# Altium footprint library Connectors_rus.PcbLib: 53 footprints (part 1 of 4)
Each footprint in its own frame and in the unit in brackets; x right, y up, seen from the top. Pads: shape width x height; smd on the part's side, far side on the other; paste and mask are expansions set on the pad; w line width, h text height; cw(c..) or ccw(c..) is an arc to the next point about the centre after c.
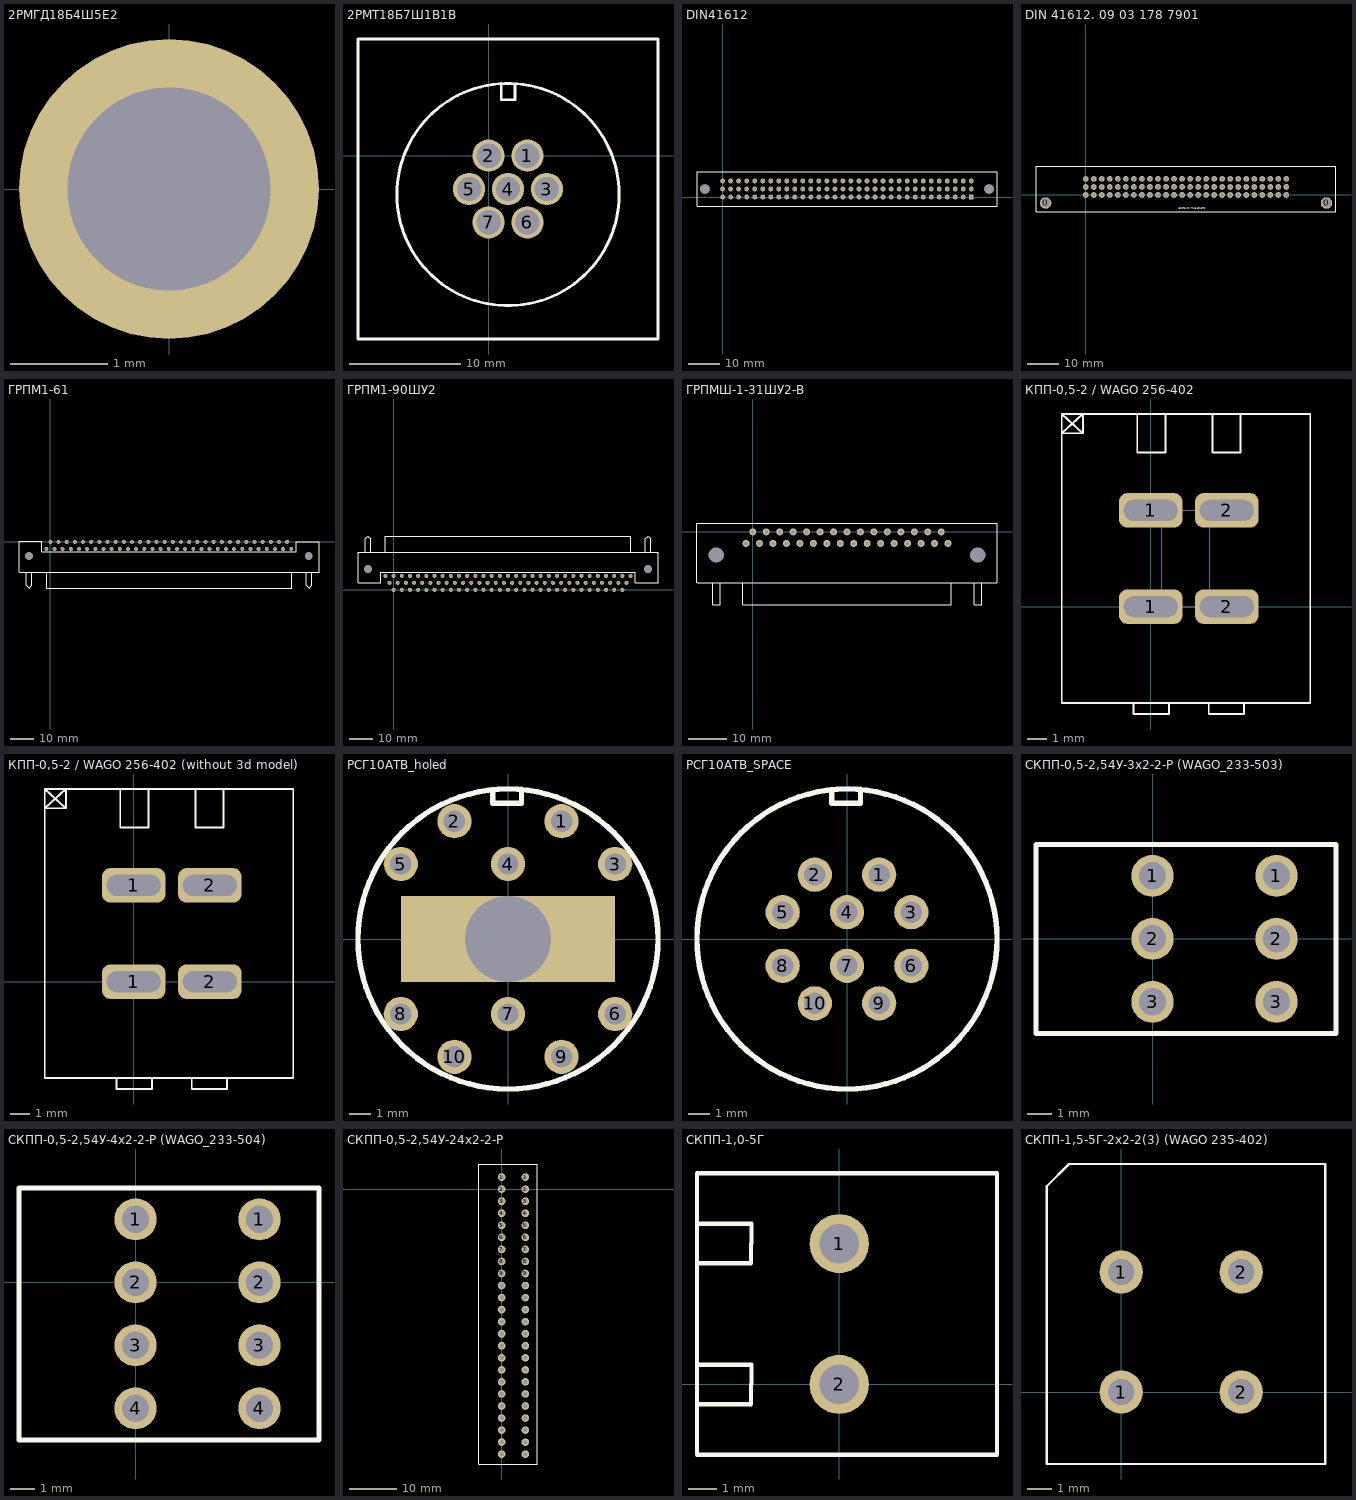
[diagram p0: the footprints below, top view; thin cyan lines are the x and y axes]

## 2РМГД18Б4Ш5Е2 [mm]
pads (1):
  round 3.1 hole 2.1 unplated: ""(0,0)

## 2РМТ18Б7Ш1В1В [mm]
pads (7):
  round 2.9 hole 2.2: 1(3.5,0) 2(0,0) 3(5.25,-3) 4(1.75,-3) 5(-1.75,-3) 6(3.5,-6) 7(0,-6)
Top Overlay:
  circle w0.254: c1.75,-3.5 r10
  lines w0.254: 1.15,6.49 1.15,5.03 2.37,5.03 2.37,6.48 ; -11.75,-16.5 -11.75,-3 -11.75,10.5 1.75,10.5 15.25,10.5 15.25,-3 15.25,-16.5 1.75,-16.5 -11.75,-16.5

## DIN41612 [mm]
height 12
pads (98):
  rect 1.5x1.5 hole 1: 1A(78.75,0)
  round 1.5 hole 1: 1B(78.74,2.54) 1C(78.74,5.08) 2A(76.2,0) 2B(76.19,2.54) 2C(76.19,5.08) 3A(73.65,0) 3B(73.64,2.54) 3C(73.64,5.08) 4A(71.12,0) 4B(71.11,2.54) 4C(71.11,5.08) 5A(68.58,0) 5B(68.57,2.54) 5C(68.57,5.08) 6A(66.04,0) 6B(66.03,2.54) 6C(66.03,5.08) 7A(63.5,0) 7B(63.49,2.54) 7C(63.49,5.08) 8A(60.96,0) 8B(60.95,2.54) 8C(60.95,5.08) 9A(58.42,0) 9B(58.41,2.54) 9C(58.41,5.08) 10A(55.88,0) 10B(55.87,2.54) 10C(55.87,5.08) 11A(53.33,0) 11B(53.32,2.54) 11C(53.32,5.08) 12A(50.78,0) 12B(50.77,2.54) 12C(50.77,5.08) 13A(48.25,0) 13B(48.24,2.54) 13C(48.24,5.08) 14A(45.71,0) 14B(45.7,2.54) 14C(45.7,5.08) 15A(43.17,0) 15B(43.16,2.54) 15C(43.16,5.08) 16A(40.63,0) 16B(40.62,2.54) 16C(40.62,5.08) 17A(38.09,0) 17B(38.08,2.54) 17C(38.08,5.08) 18A(35.55,0) 18B(35.54,2.54) 18C(35.54,5.08) 19A(33.02,0) 19B(33.01,2.54) 19C(33.01,5.08) 20A(30.47,0) 20B(30.46,2.54) 20C(30.46,5.08) 21A(27.92,0) 21B(27.91,2.54) 21C(27.91,5.08) 22A(25.39,0) 22B(25.38,2.54) 22C(25.38,5.08) 23A(22.85,0) 23B(22.84,2.54) 23C(22.84,5.08) 24A(20.31,0) 24B(20.3,2.54) 24C(20.3,5.08) 25A(17.77,0) 25B(17.76,2.54) 25C(17.76,5.08) 26A(15.23,0) 26B(15.22,2.54) 26C(15.22,5.08) 27A(12.69,0) 27B(12.68,2.54) 27C(12.68,5.08) 28A(10.15,0) 28B(10.14,2.54) 28C(10.14,5.08) 29A(7.6,0) 29B(7.59,2.54) 29C(7.59,5.08) 30A(5.05,0) 30B(5.04,2.54) 30C(5.04,5.08) 31A(2.52,0) 31B(2.51,2.54) 31C(2.51,5.08) 32A(-0.02,0) 32B(-0.03,2.54) 32C(-0.03,5.08)
  round 3 hole 3: MH1(-5.63,2.54) MH2(84.37,2.54)
Top Overlay:
  lines w0.254: -8.13,-2.86 86.87,-2.86 86.87,7.94 -8.13,7.94 -8.13,-2.86

## DIN 41612. 09 03 178 7901 [mm]
pads (80):
  round 3.6 hole 3: 0(-12.7,-2.54) 0(76.2,-2.54)
  round 1.8 hole 1.2: A1(63.5,0) A2(60.96,0) A3(58.42,0) A4(55.88,0) A5(53.34,0) A6(50.8,0) A7(48.26,0) A8(45.72,0) A9(43.18,0) A10(40.64,0) A11(38.1,0) A12(35.56,0) A13(33.02,0) A14(30.48,0) A15(27.94,0) A16(25.4,0) A17(22.86,0) A18(20.32,0) A19(17.78,0) A20(15.24,0) A21(12.7,0) A22(10.16,0) A23(7.62,0) A24(5.08,0) A25(2.54,0) A26(0,0) B1(63.5,2.54) B2(60.96,2.54) B3(58.42,2.54) B4(55.88,2.54) B5(53.34,2.54) B6(50.8,2.54) B7(48.26,2.54) B8(45.72,2.54) B9(43.18,2.54) B10(40.64,2.54) B11(38.1,2.54) B12(35.56,2.54) B13(33.02,2.54) B14(30.48,2.54) B15(27.94,2.54) B16(25.4,2.54) B17(22.86,2.54) B18(20.32,2.54) B19(17.78,2.54) B20(15.24,2.54) B21(12.7,2.54) B22(10.16,2.54) B23(7.62,2.54) B24(5.08,2.54) B25(2.54,2.54) B26(0,2.54) C1(63.5,5.08) C2(60.96,5.08) C3(58.42,5.08) C4(55.88,5.08) C5(53.34,5.08) C6(50.8,5.08) C7(48.26,5.08) C8(45.72,5.08) C9(43.18,5.08) C10(40.64,5.08) C11(38.1,5.08) C12(35.56,5.08) C13(33.02,5.08) C14(30.48,5.08) C15(27.94,5.08) C16(25.4,5.08) C17(22.86,5.08) C18(20.32,5.08) C19(17.78,5.08) C20(15.24,5.08) C21(12.7,5.08) C22(10.16,5.08) C23(7.62,5.08) C24(5.08,5.08) C25(2.54,5.08) C26(0,5.08)
Top Overlay:
  lines w0.3: -15.75,-5.25 79.15,-5.25 79.2,-5.2 79.2,-2.54 79.2,9.02 -15.7,9.02 -15.75,8.97 -15.75,-2.59 -15.75,-5.25
  text "EDGE OF THE BOARD" at 29.45,-4.82 h1

## ГРПМ1-61 [mm]
pads (63):
  round 1.6 hole 3.4: 0(-9.25,-6) 0(110.75,-6)
  round 1.7 hole 1.1: A1(0,0) A2(3.5,0) A3(7,0) A4(10.5,0) A5(14,0) A6(17.5,0) A7(21,0) A8(24.5,0) A9(28,0) A10(31.5,0) A11(35,0) A12(38.5,0) A13(42,0) A14(45.5,0) A15(49,0) A16(52.5,0) A17(56,0) A18(59.5,0) A19(63,0) A20(66.5,0) A21(70,0) A22(73.5,0) A23(77,0) A24(80.5,0) A25(84,0) A26(87.5,0) A27(91,0) A28(94.5,0) A29(98,0) A30(101.5,0) B1(-1.75,-3) B2(1.75,-3) B3(5.25,-3) B4(8.75,-3) B5(12.25,-3) B6(15.75,-3) B7(19.25,-3) B8(22.75,-3) B9(26.25,-3) B10(29.75,-3) B11(33.25,-3) B12(36.75,-3) B13(40.25,-3) B14(43.75,-3) B15(47.25,-3) B16(50.75,-3) B17(54.25,-3) B18(57.75,-3) B19(61.25,-3) B20(64.75,-3) B21(68.25,-3) B22(71.75,-3) B23(75.25,-3) B24(78.75,-3) B25(82.25,-3) B26(85.75,-3) B27(89.25,-3) B28(92.75,-3) B29(96.25,-3) B30(99.75,-3) B31(103.25,-3)
Top Overlay:
  lines w0.2: -13.45,-13 110.8,-13 ; -13.45,-12.9 -13.45,0.3 -3.7,0.3 -3.7,-4.2 105.3,-4.2 ; -10.3,-13 -10.3,-18.6 -9.1,-19.8 -7.9,-18.6 -7.9,-13 ; -1.6,-13 -1.6,-19.8 103.4,-19.8 103.4,-13 ; 105.4,-4.4 105.4,0.1 110.9,0.1 115.15,0.1 115.15,-13.1 ; 109.7,-13 109.7,-18.6 110.9,-19.8 112.1,-18.6 112.1,-13 ; 110.9,-13 115.15,-13
3D body "ГРПМШ-61.stp": height 8, standoff -4.2, extent -14.069,-20.015 115.931,0.41

## ГРПМ1-90ШУ2 [mm]
pads (92):
  round 1.6 hole 3.4: 0(-11,9) 0(109,9)
  round 1.7 hole 1.1: A1(0,0) A2(3.5,0) A3(7,0) A4(10.5,0) A5(14,0) A6(17.5,0) A7(21,0) A8(24.5,0) A9(28,0) A10(31.5,0) A11(35,0) A12(38.5,0) A13(42,0) A14(45.5,0) A15(49,0) A16(52.5,0) A17(56,0) A18(59.5,0) A19(63,0) A20(66.5,0) A21(70,0) A22(73.5,0) A23(77,0) A24(80.5,0) A25(84,0) A26(87.5,0) A27(91,0) A28(94.5,0) A29(98,0) Б1(-1.75,3) Б2(1.75,3) Б3(5.25,3) Б4(8.75,3) Б5(12.25,3) Б6(15.75,3) Б7(19.25,3) Б8(22.75,3) Б9(26.25,3) Б10(29.75,3) Б11(33.25,3) Б12(36.75,3) Б13(40.25,3) Б14(43.75,3) Б15(47.25,3) Б16(50.75,3) Б17(54.25,3) Б18(57.75,3) Б19(61.25,3) Б20(64.75,3) Б21(68.25,3) Б22(71.75,3) Б23(75.25,3) Б24(78.75,3) Б25(82.25,3) Б26(85.75,3) Б27(89.25,3) Б28(92.75,3) Б29(96.25,3) Б30(99.75,3) В1(-3.5,6) В2(0,6) В3(3.5,6) В4(7,6) В5(10.5,6) В6(14,6) В7(17.5,6) В8(21,6) В9(24.5,6) В10(28,6) В11(31.5,6) В12(35,6) В13(38.5,6) В14(42,6) В15(45.5,6) В16(49,6) В17(52.5,6) В18(56,6) В19(59.5,6) В20(63,6) В21(66.5,6) В22(70,6) В23(73.5,6) В24(77,6) В25(80.5,6) В26(84,6) В27(87.5,6) В28(91,6) В29(94.5,6) В30(98,6) В31(101.5,6)
Top Overlay:
  lines w0.2: -12.2,16.2 -12.2,21.8 -11,23 -9.8,21.8 -9.8,16.2 ; -3.5,16.2 -3.5,23 101.5,23 101.5,16.2 ; 107.8,16.2 107.8,21.8 109,23 110.2,21.8 110.2,16.2 ; -15.25,3 -15.25,16.2 -11,16.2 113.25,16.2 113.25,3 103.5,3 103.5,7.5 -5.5,7.5 -5.5,3 -11,3 -15.25,3
3D body: height 10.5, standoff 0, extent -15.25,3 113.25,16.2
3D body: height 9.4, standoff 8.6, extent -3.897,14.3 -3.1,22.3
3D body: height 9.4, standoff 8.6, extent -0.397,14.3 0.4,22.3
3D body: height 9.4, standoff 8.6, extent 3.103,14.3 3.9,22.3
3D body: height 9.4, standoff 8.6, extent 6.603,14.3 7.4,22.3
3D body: height 9.4, standoff 8.6, extent 10.103,14.3 10.9,22.3
3D body: height 9.4, standoff 8.6, extent 13.603,14.3 14.4,22.3
3D body: height 9.4, standoff 8.6, extent 17.103,14.3 17.9,22.3
3D body: height 9.4, standoff 8.6, extent 20.603,14.3 21.4,22.3
3D body: height 9.4, standoff 8.6, extent 24.103,14.3 24.9,22.3
3D body: height 9.4, standoff 8.6, extent 27.603,14.3 28.4,22.3
3D body: height 9.4, standoff 8.6, extent 31.103,14.3 31.9,22.3
3D body: height 9.4, standoff 8.6, extent 34.603,14.3 35.4,22.3
3D body: height 9.4, standoff 8.6, extent 38.103,14.3 38.9,22.3
3D body: height 9.4, standoff 8.6, extent 41.603,14.3 42.4,22.3
3D body: height 9.4, standoff 8.6, extent 45.103,14.3 45.9,22.3
3D body: height 9.4, standoff 8.6, extent 48.603,14.3 49.4,22.3
3D body: height 9.4, standoff 8.6, extent 52.103,14.3 52.9,22.3
3D body: height 9.4, standoff 8.6, extent 55.603,14.3 56.4,22.3
3D body: height 9.4, standoff 8.6, extent 59.103,14.3 59.9,22.3
3D body: height 9.4, standoff 8.6, extent 62.603,14.3 63.4,22.3
3D body: height 9.4, standoff 8.6, extent 66.103,14.3 66.9,22.3
3D body: height 9.4, standoff 8.6, extent 69.603,14.3 70.4,22.3
3D body: height 9.4, standoff 8.6, extent 73.103,14.3 73.9,22.3
3D body: height 9.4, standoff 8.6, extent 76.603,14.3 77.4,22.3
3D body: height 9.4, standoff 8.6, extent 80.103,14.3 80.9,22.3
3D body: height 9.4, standoff 8.6, extent 83.603,14.3 84.4,22.3
3D body: height 9.4, standoff 8.6, extent 87.103,14.3 87.9,22.3
3D body: height 9.4, standoff 8.6, extent 90.603,14.3 91.4,22.3
3D body: height 9.4, standoff 8.6, extent 94.103,14.3 94.9,22.3
3D body: height 9.4, standoff 8.6, extent 97.603,14.3 98.4,22.3
3D body: height 9.4, standoff 8.6, extent 101.103,14.3 101.9,22.3
3D body: height 6.4, standoff 5.6, extent -2.147,15.8 -1.35,22.3
3D body: height 6.4, standoff 5.6, extent 1.353,15.8 2.15,22.3
3D body: height 6.4, standoff 5.6, extent 4.853,15.8 5.65,22.3
3D body: height 6.4, standoff 5.6, extent 8.353,15.8 9.15,22.3
3D body: height 6.4, standoff 5.6, extent 11.853,15.8 12.65,22.3
3D body: height 6.4, standoff 5.6, extent 15.353,15.8 16.15,22.3
3D body: height 6.4, standoff 5.6, extent 18.853,15.8 19.65,22.3
3D body: height 6.4, standoff 5.6, extent 22.353,15.8 23.15,22.3
3D body: height 6.4, standoff 5.6, extent 25.853,15.8 26.65,22.3
3D body: height 6.4, standoff 5.6, extent 29.303,15.8 30.1,22.3
3D body: height 6.4, standoff 5.6, extent 32.853,15.8 33.65,22.3
3D body: height 6.4, standoff 5.6, extent 36.353,15.8 37.15,22.3
3D body: height 6.4, standoff 5.6, extent 39.853,15.8 40.65,22.3
3D body: height 6.4, standoff 5.6, extent 43.353,15.8 44.15,22.3
3D body: height 6.4, standoff 5.6, extent 47.003,15.8 47.8,22.3
3D body: height 6.4, standoff 5.6, extent 50.353,15.8 51.15,22.3
3D body: height 6.4, standoff 5.6, extent 53.853,15.8 54.65,22.3
3D body: height 6.4, standoff 5.6, extent 57.353,15.8 58.15,22.3
3D body: height 6.4, standoff 5.6, extent 60.853,15.8 61.65,22.3
3D body: height 6.4, standoff 5.6, extent 64.353,15.8 65.15,22.3
3D body: height 6.4, standoff 5.6, extent 67.853,15.8 68.65,22.3
3D body: height 6.4, standoff 5.6, extent 71.353,15.8 72.15,22.3
3D body: height 6.4, standoff 5.6, extent 74.853,15.8 75.65,22.3
3D body: height 6.4, standoff 5.6, extent 78.353,15.8 79.15,22.3
3D body: height 6.4, standoff 5.6, extent 81.853,15.8 82.65,22.3
3D body: height 6.4, standoff 5.6, extent 85.353,15.8 86.15,22.3
3D body: height 6.4, standoff 5.6, extent 88.853,15.8 89.65,22.3
3D body: height 6.4, standoff 5.6, extent 92.353,15.8 93.15,22.3
3D body: height 6.4, standoff 5.6, extent 95.853,15.8 96.65,22.3
3D body: height 6.4, standoff 5.6, extent 99.353,15.8 100.15,22.3
3D body: height 3.4, standoff 2.6, extent -0.397,15.8 0.4,22.3
3D body: height 3.4, standoff 2.6, extent 3.103,15.8 3.9,22.3
3D body: height 3.4, standoff 2.6, extent 6.603,15.8 7.4,22.3
3D body: height 3.4, standoff 2.6, extent 10.103,15.8 10.9,22.3
3D body: height 3.4, standoff 2.6, extent 24.103,15.8 24.9,22.3
3D body: height 3.4, standoff 2.6, extent 20.603,15.8 21.4,22.3
3D body: height 3.4, standoff 2.6, extent 17.103,15.8 17.9,22.3
3D body: height 3.4, standoff 2.6, extent 13.603,15.8 14.4,22.3
3D body: height 3.4, standoff 2.6, extent 38.103,15.8 38.9,22.3
3D body: height 3.4, standoff 2.6, extent 34.603,15.8 35.4,22.3
3D body: height 3.4, standoff 2.6, extent 31.103,15.8 31.9,22.3
3D body: height 3.4, standoff 2.6, extent 27.603,15.8 28.4,22.3
3D body: height 3.4, standoff 2.6, extent 52.103,15.8 52.9,22.3
3D body: height 3.4, standoff 2.6, extent 48.603,15.8 49.4,22.3
3D body: height 3.4, standoff 2.6, extent 45.103,15.8 45.9,22.3
3D body: height 3.4, standoff 2.6, extent 41.603,15.8 42.4,22.3
3D body: height 3.4, standoff 2.6, extent 66.103,15.8 66.9,22.3
3D body: height 3.4, standoff 2.6, extent 62.603,15.8 63.4,22.3
3D body: height 3.4, standoff 2.6, extent 59.103,15.8 59.9,22.3
3D body: height 3.4, standoff 2.6, extent 55.603,15.8 56.4,22.3
3D body: height 3.4, standoff 2.6, extent 80.103,15.8 80.9,22.3
3D body: height 3.4, standoff 2.6, extent 76.603,15.8 77.4,22.3
3D body: height 3.4, standoff 2.6, extent 73.103,15.8 73.9,22.3
3D body: height 3.4, standoff 2.6, extent 69.603,15.8 70.4,22.3
3D body: height 3.4, standoff 2.6, extent 94.103,15.8 94.9,22.3
3D body: height 3.4, standoff 2.6, extent 90.603,15.8 91.4,22.3
3D body: height 3.4, standoff 2.6, extent 87.103,15.8 87.9,22.3
3D body: height 3.4, standoff 2.6, extent 83.603,15.8 84.4,22.3
3D body: height 3.4, standoff 2.6, extent 97.603,15.8 98.4,22.3
3D body: height 6.5, standoff 3.5, extent -12.488,14.3 -9.5,22.3
3D body: height 6.5, standoff 3.5, extent 107.512,14.3 110.5,22.3

## ГРПМШ-1-31ШУ2-В [mm]
pads (33):
  round 1.8 hole 4: 0(-9.5,-6) 0(58.5,-6)
  round 1.8 hole 1: A1(49,0) A2(45.5,0) A3(42,0) A4(38.5,0) A5(35,0) A6(31.5,0) A7(28,0) A8(24.5,0) A9(21,0) A10(17.5,0) A11(14,0) A12(10.5,0) A13(7,0) A14(3.5,0) A15(0,0) B1(50.75,-3) B2(47.25,-3) B3(43.75,-3) B4(40.25,-3) B5(36.75,-3) B6(33.25,-3) B7(29.75,-3) B8(26.25,-3) B9(22.75,-3) B10(19.25,-3) B11(15.75,-3) B12(12.25,-3) B13(8.75,-3) B14(5.25,-3) B15(1.75,-3) B16(-1.75,-3)
Top Overlay:
  lines w0.1: -14.5,2.23 -9.5,2.23
  lines w0.15: -14.5,-13.2 -14.5,-6 -14.5,2.23 ; -14.47,-13.2 -9.5,-13.2 63.47,-13.2 ; -10.42,-13.21 -10.42,-18.94 -9.44,-18.94 -8.46,-18.94 -8.46,-13.21 ; -9.5,2.23 19.89,2.23 58.5,2.23 63.5,2.23 63.5,-6 63.5,-13.2 ; -2.66,-13.2 -2.66,-18.94 51.65,-18.94 51.65,-13.2 ; 57.58,-13.21 57.58,-18.94 58.56,-18.94 59.54,-18.94 59.54,-13.21

## КПП-0,5-2 / WAGO 256-402 [mm]
pads (4):
  rrect50% 3.3x1.8 hole 1.1 slot 2.8 at 0 deg: 1(0,0) 1(0,5) 2(3.95,0) 2(3.95,5)
Top Overlay:
  lines w0.1: -0.89,-5 -0.89,-5.57 0.03,-5.57 0.95,-5.57 0.95,-5 ; -0.69,10 -0.7,10 -0.7,8 0.03,8 0.76,8 0.76,10 ; 3.01,-5 3.01,-5.57 3.93,-5.57 4.85,-5.57 4.85,-5 ; 3.2,10 3.2,8 3.93,8 4.66,8 4.66,10 ; -4.62,9 -3.52,10 -3.52,9 ; -4.62,9 -3.52,9 ; -4.62,9 -3.52,9 ; -4.62,10 -3.52,9 ; -4.62,10 -4.62,-5 8.28,-5 8.28,10 -4.62,10
Mechanical 1:
  lines w0.01: 0.57,-0.003 3.07,-0.003 3.07,4.997 0.57,4.997 0.57,-0.003
3D body "User Library-WAGO256-401-256-100.STEP": height 18.81, standoff -4, extent 0.36,-5.029 8.26,10
3D body "User Library-WAGO256-401-256-100.STEP": height 18.81, standoff -4, extent -4.64,-5.029 3.26,10
3D body: height 5.7, standoff -2, extent 2.695,4.747 3.445,5.247
3D body: height 5.7, standoff -2, extent 0.195,4.747 0.945,5.247
3D body: height 5.7, standoff -2, extent 0.195,-0.253 0.945,0.247
3D body: height 5.7, standoff -2, extent 2.695,-0.253 3.445,0.247

## КПП-0,5-2 / WAGO 256-402 (without 3d model) [mm]
pads (4):
  rrect50% 3.3x1.8 hole 1.1 slot 2.8 at 0 deg: 1(0,0) 1(0,5) 2(3.95,0) 2(3.95,5)
Top Overlay:
  lines w0.1: -0.89,-5 -0.89,-5.57 0.03,-5.57 0.95,-5.57 0.95,-5 ; -0.69,10 -0.7,10 -0.7,8 0.03,8 0.76,8 0.76,10 ; 3.01,-5 3.01,-5.57 3.93,-5.57 4.85,-5.57 4.85,-5 ; 3.2,10 3.2,8 3.93,8 4.66,8 4.66,10 ; -4.62,9 -3.52,10 -3.52,9 ; -4.62,9 -3.52,9 ; -4.62,9 -3.52,9 ; -4.62,10 -3.52,9 ; -4.62,10 -4.62,-5 8.28,-5 8.28,10 -4.62,10

## РСГ10АТВ_holed [mm]
pads (11):
  round 1.6 hole 1: 1(2.5,5.5) 2(-2.5,5.5) 3(5,3.5) 4(0,3.5) 5(-5,3.5) 6(5,-3.5) 7(0,-3.5) 8(-5,-3.5) 9(2.5,-5.5) 10(-2.5,-5.5)
  rect 10x4 hole 4 square unplated: ""(0,0)
Top Overlay:
  circle w0.254: c0,0 r7
  lines w0.254: -0.729,6.973 -0.708,6.973 -0.708,6.33 0.631,6.33 0.631,6.984
Bottom Overlay:
  text "10" at -2,-4.25 h1.4
  text "9" at 2.75,-4.25 h1.4
  text "7" at 0.25,-5.5 h1.4
  text "8" at -5.5,-2.5 h1.4
  text "6" at 6,-2.5 h1.4
  text "5" at -5.75,1.75 h1.4
  text "3" at 6.25,1.75 h1.4
  text "4" at 0.25,4.75 h1.4
  text "2" at -2.25,3.5 h1.4
  text "1" at 2.75,3.5 h1.4
3D body "RSG10ATV.stp": height 16.5, standoff 1, extent -10,-10 10,10

## РСГ10АТВ_SPACE [mm]
pads (10):
  round 1.6 hole 1: 1(1.5,3) 2(-1.5,3) 3(3,1.25) 4(0,1.25) 5(-3,1.25) 6(3,-1.25) 7(0,-1.25) 8(-3,-1.25) 9(1.5,-3) 10(-1.5,-3)
Top Overlay:
  circle w0.254: c0,0 r7
  lines w0.254: -0.729,6.973 -0.708,6.973 -0.708,6.33 0.631,6.33 0.631,6.984
Bottom Overlay:
  text "10" at -1.092,-5.025 h1.4
  text "9" at 1.758,-5.025 h1.4
  text "7" at 0.257,-3.424 h1.4
  text "5" at -4.243,0.826 h1.4
  text "8" at -4.243,-1.674 h1.4
  text "6" at 4.591,-1.649 h1.4
  text "3" at 4.591,0.9 h1.4
  text "4" at 0.25,2.329 h1.4
  text "2" at -1.25,4.079 h1.4
  text "1" at 1.698,4.104 h1.4
3D body "RSG10ATV.stp": height 16.5, standoff 1, extent -10,-10 10,10

## СКПП-0,5-2,54У-3x2-2-P (WAGO_233-503) [mm]
pads (6):
  round 1.7 hole 1.1: 1(0,2.54) 1(5,2.54) 2(0,0) 2(5,0) 3(0,-2.54) 3(5,-2.54)
Top Overlay:
  lines w0.2: -4.7,-3.815 7.4,-3.815 7.4,0 7.4,3.8 -4.7,3.8 -4.7,-3.815
3D body "233-502.stp": height 16.44, standoff -4, extent -4.812,-2.16 7.512,5.22
3D body "233-502.stp": height 16.44, standoff -4, extent -4.812,-4.7 7.512,2.68

## СКПП-0,5-2,54У-4x2-2-P (WAGO_233-504) [mm]
pads (8):
  round 1.7 hole 1.1: 1(0,2.54) 1(5,2.54) 2(0,0) 2(5,0) 3(0,-2.54) 3(5,-2.54) 4(0,-5.08) 4(5,-5.08)
Top Overlay:
  lines w0.2: -4.7,-6.355 -4.7,3.8 7.4,3.8 7.4,0 7.4,-6.355 -4.7,-6.355
3D body "233-502.stp": height 16.44, standoff -4, extent -4.812,-2.16 7.512,5.22
3D body "233-502.stp": height 16.44, standoff -4, extent -4.812,-4.7 7.512,2.68
3D body "233-502.stp": height 16.44, standoff -4, extent -4.812,-7.24 7.512,0.14

## СКПП-0,5-2,54У-24х2-2-Р [mm]
height 15.5
pads (48):
  round 1.6 hole 1: 1(0,2.54) 1(5,2.54) 2(0,0) 2(5,0) 3(0,-2.54) 3(5,-2.54) 4(0,-5.08) 4(5,-5.08) 5(0,-7.62) 5(5,-7.62) 6(0,-10.16) 6(5,-10.16) 7(0,-12.7) 7(5,-12.7) 8(0,-15.24) 8(5,-15.24) 9(0,-17.78) 9(5,-17.78) 10(0,-20.32) 10(5,-20.32) 11(0,-22.86) 11(5,-22.86) 12(0,-25.4) 12(5,-25.4) 13(0,-27.94) 13(5,-27.94) 14(0,-30.48) 14(5,-30.48) 15(0,-33.02) 15(5,-33.02) 16(0,-35.56) 16(5,-35.56) 17(0,-38.1) 17(5,-38.1) 18(0,-40.64) 18(5,-40.64) 19(0,-43.18) 19(5,-43.18) 20(0,-45.72) 20(5,-45.72) 21(0,-48.26) 21(5,-48.26) 22(0,-50.8) 22(5,-50.8) 23(0,-53.34) 23(5,-53.34) 24(0,-55.88) 24(5,-55.88)
Top Overlay:
  lines w0.2: -4.824,-57.95 -4.824,5.31 7.5,5.31 7.5,-57.95 -4.824,-57.95
Mechanical 1:
  lines w0.2: 0,-53.34 0,-50.8 ; 0,-48.26 0,-45.72 ; 0,-43.18 0,-40.64 ; 0,-38.1 0,-35.56
3D body "233-502.stp": height 16.44, standoff -4, extent -4.824,-2.07 7.5,5.31
3D body "233-502.stp": height 16.44, standoff -4, extent -4.824,-7.15 7.5,0.23
3D body "233-502.stp": height 16.44, standoff -4, extent -4.824,-12.23 7.5,-4.85
3D body "233-502.stp": height 16.44, standoff -4, extent -4.824,-17.31 7.5,-9.93
3D body "233-502.stp": height 16.44, standoff -4, extent -4.824,-22.39 7.5,-15.01
3D body "233-502.stp": height 16.44, standoff -4, extent -4.824,-27.47 7.5,-20.09
3D body "233-502.stp": height 16.44, standoff -4, extent -4.824,-32.55 7.5,-25.17
3D body "233-502.stp": height 16.44, standoff -4, extent -4.824,-37.63 7.5,-30.25
3D body "233-502.stp": height 16.44, standoff -4, extent -4.824,-42.71 7.5,-35.33
3D body "233-502.stp": height 16.44, standoff -4, extent -4.824,-47.79 7.5,-40.41
3D body "233-502.stp": height 16.44, standoff -4, extent -4.824,-52.87 7.5,-45.49
3D body "233-502.stp": height 16.44, standoff -4, extent -4.824,-57.95 7.5,-50.57

## СКПП-1,0-5Г [mm]
pads (2):
  round 2.1 hole 1.4 unplated: 1(0,5) 2(0,0)
Top Overlay:
  lines w0.15: -5.05,-0.7 -3.13,-0.7 -3.13,0 ; -5.05,4.3 -3.13,4.3 -3.13,5 -3.12,5 -3.12,5.7 -5.04,5.7 ; -5.04,0.7 -3.12,0.7 -3.12,0 ; -5.05,-2.5 0,-2.5 5.6,-2.5 5.6,7.5 0,7.5 -5.05,7.5 -5.05,7.19 -5.05,-2.5
3D body "pxc_1792863_02_PTS-1-5-2-5-0-H_3D.stp": height 13.72, standoff -2.38, extent -5.01,-2.47 5.49,7.53

## СКПП-1,5-5Г-2х2-2(3) (WAGO 235-402) [mm]
pads (4):
  round 1.8 hole 1.1: 1(0,0) 1(0,5) 2(5,0) 2(5,5)
Top Overlay:
  lines w0.1: -3.1,-3 -3.1,8.575 -2.175,9.5 8.5,9.5 8.5,-3 -3.1,-3
3D body "235-402.stp": height 9.1, standoff -3.6, extent -3,-3 8.5,9.6